# Altium footprint library connectors.PcbLib: 98 footprints (part 4 of 7)
Each footprint in its own frame and in the unit in brackets; x right, y up, seen from the top. Pads: shape width x height; smd on the part's side, far side on the other; paste and mask are expansions set on the pad; w line width, h text height; cw(c..) or ccw(c..) is an arc to the next point about the centre after c.
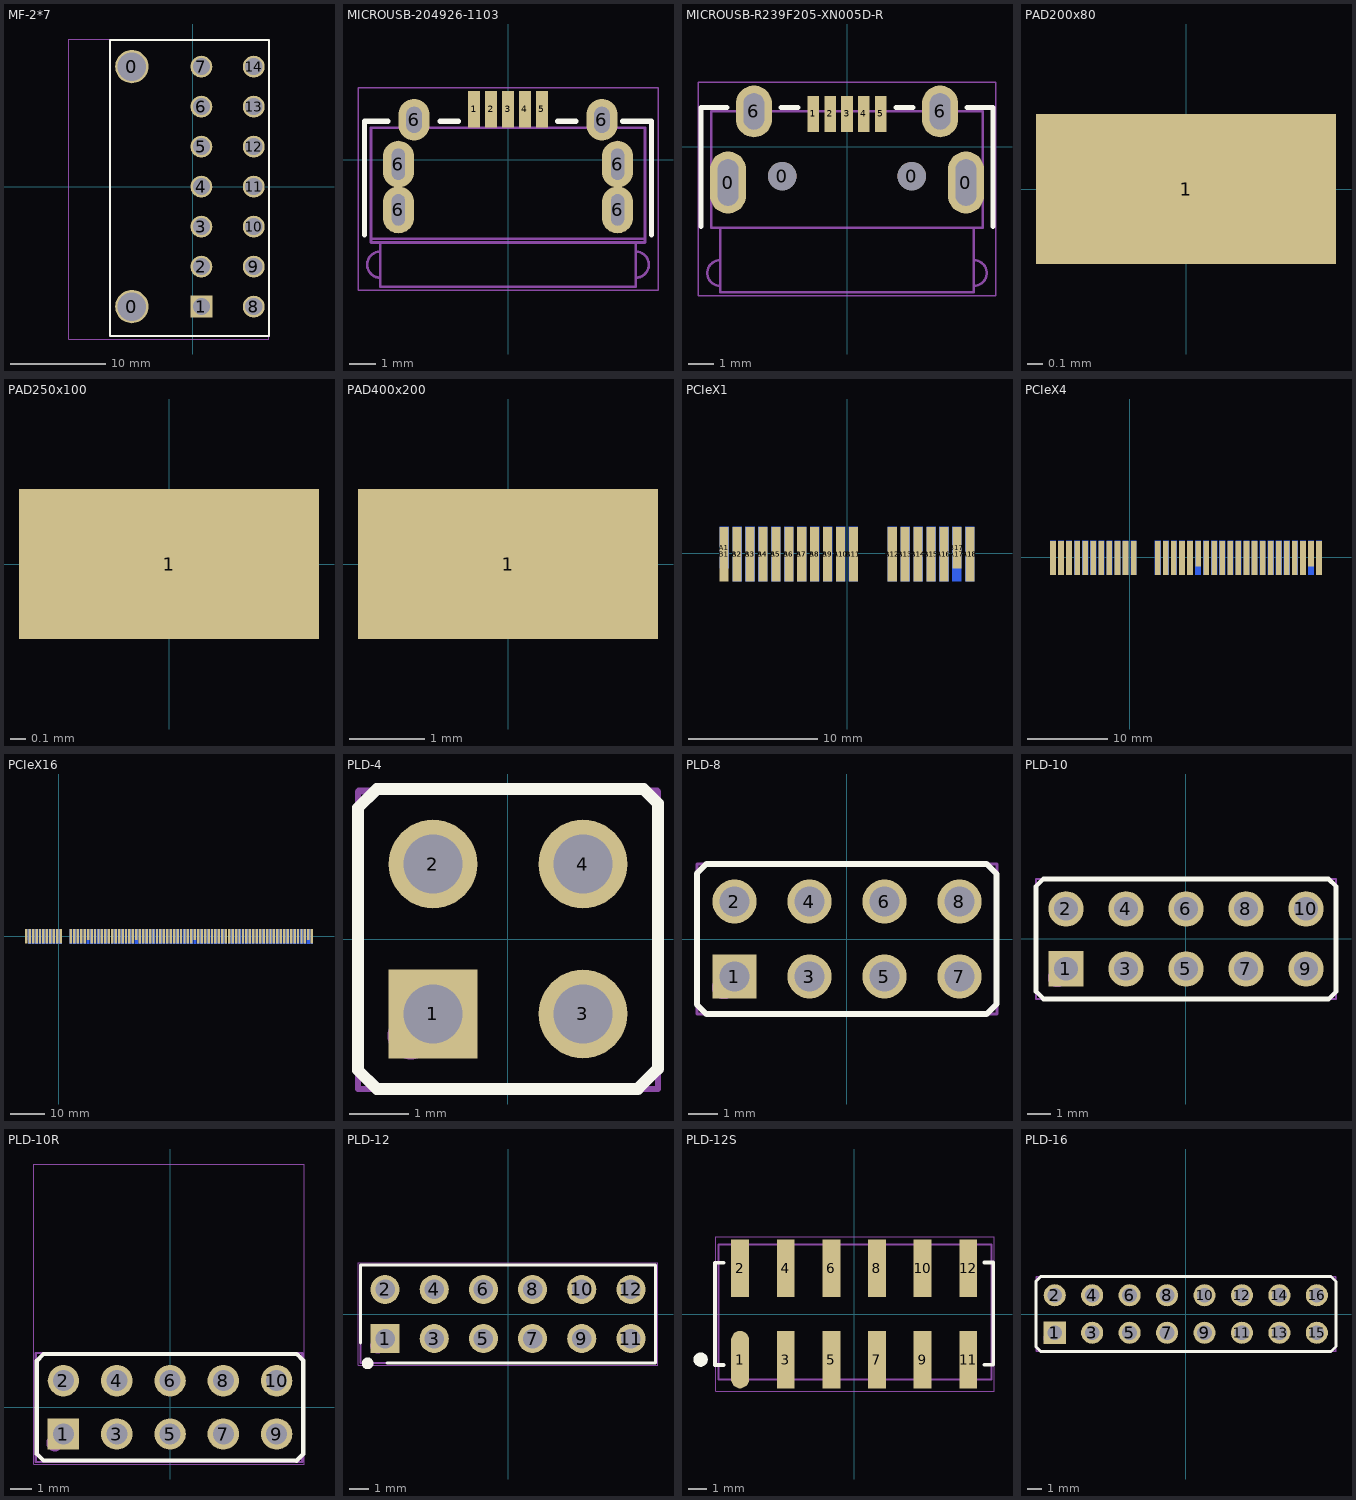
[diagram p3: the footprints below, top view; thin cyan lines are the x and y axes]

## MF-2*7 [mm]
pads (16):
  round 3.5 hole 3: 0(-6.4,-12.6) 0(-6.4,12.6)
  rect 2.3x2.3 hole 1.8: 1(0.9,-12.6)
  round 2.3 hole 1.8: 2(0.9,-8.4) 3(0.9,-4.2) 4(0.9,0) 5(0.9,4.2) 6(0.9,8.4) 7(0.9,12.6) 8(6.4,-12.6) 9(6.4,-8.4) 10(6.4,-4.2) 11(6.4,0) 12(6.4,4.2) 13(6.4,8.4) 14(6.4,12.6)
Top Overlay:
  lines w0.2: -8.7,-15.7 8,-15.7 8,15.4 -8.7,15.4 -8.7,-15.7
Top Assy:
  lines w0.1: -8.6,-15.7 8,-15.7 8,15.4 -8.6,15.4 -8.6,-15.7
Top Cortyard:
  lines w0.05: -13,-16 -13,15.5 8,15.5 8,-16 -13,-16
3D body "MF-2x7.stp": height 11.4, standoff -3.6, extent -13,-15.7 6.935,15.3

## MICROUSB-204926-1103 [mm] "Molex Sealed USB"
pads (11):
  rect 0.45x1.4 smd: 1(-1.3,1.925) 2(-0.65,1.925) 3(0,1.925) 4(0.65,1.925) 5(1.3,1.925)
  oval 1.2x1.8 hole 0.5 slot 1.2 at 90 deg: 6(-4.2,-1.925) 6(-4.2,-0.175) 6(4.2,-1.925) 6(4.2,-0.175)
  oval 1.2x1.6 hole 0.6 slot 1 at 90 deg: 6(-3.6,1.525) 6(3.6,1.525)
Top Overlay:
  lines w0.2: -5.5,-2.875 -5.5,1.475 -4.6,1.475 ; -2.6,1.475 -1.9,1.475 ; 1.9,1.475 2.6,1.475 ; 4.4,1.475 5.5,1.475 5.5,-2.875
Top Assy:
  lines w0.1: -5.25,-3.025 5.25,-3.025 ; -4.9,-4.525 cw(c-4.9,-4.025) -4.9,-3.525 ; -4.9,-3.175 -4.9,-4.875 4.9,-4.875 4.9,-3.175 ; 4.9,-4.525 ccw(c4.9,-4.025) 4.9,-3.525 ; -5.25,-3.175 5.25,-3.175 5.25,1.225 -5.25,1.225 -5.25,-3.175
Top Cortyard:
  lines w0.05: -5.75,-5 5.75,-5 5.75,2.75 -5.75,2.75 -5.75,-5
3D body "2049261103.stp": height 3.95, standoff -1, extent -4.65,-4.825 4.65,2.175

## MICROUSB-R239F205-XN005D-R [mm] "Astron Sealed USB"
pads (11):
  oval 1.4x2.4 hole 0.8 slot 1.8 at 90 deg unplated: 0(-4.6,-1.375) 0(4.6,-1.375)
  round 1.1 hole 1.1 unplated: 0(-2.5,-1.125) 0(2.5,-1.125)
  rect 0.45x1.4 smd: 1(-1.3,1.275) 2(-0.65,1.275) 3(0,1.275) 4(0.65,1.275) 5(1.3,1.275)
  oval 1.4x2 hole 0.8 slot 1.4 at 90 deg unplated: 6(-3.6,1.375) 6(3.6,1.375)
Top Overlay:
  lines w0.2: -5.65,-3.075 -5.65,1.525 -4.65,1.525 ; -2.55,1.525 -1.9,1.525 ; 1.9,1.525 2.55,1.525 ; 4.65,1.525 5.65,1.525 5.65,-3.075
Top Assy:
  lines w0.1: -4.9,-5.375 cw(c-4.9,-4.875) -4.9,-4.375 ; -4.9,-3.125 -4.9,-5.625 4.9,-5.625 4.9,-3.125 ; 4.9,-5.375 ccw(c4.9,-4.875) 4.9,-4.375 ; -5.25,-3.125 -5.25,1.375 5.25,1.375 5.25,-3.125 -5.25,-3.125
Top Cortyard:
  lines w0.05: -5.75,-5.75 5.75,-5.75 5.75,2.5 -5.75,2.5 -5.75,-5.75
3D body "USB_разъем_R239F205-XN005D-R_(условно).STEP": height 5.48, standoff -1.5, extent -5.5,-5.65 5.5,1.35

## PAD200x80 [mm] "2mm x 0.8mm SMD Pad"
pads (1):
  rect 2x1 smd: 1(0,0)

## PAD250x100 [mm] "2.5mm x 1.0mm SMD Pad"
pads (1):
  rect 2x1 smd: 1(0,0)

## PAD400x200 [mm] "4mm x 2mm SMD Pad"
pads (1):
  rect 4x2 smd: 1(0,0)

## PCIeX1 [mm] "Golden finger, PCIeX1, Dual, Opposite, Pitch 1mm, 36-Position"
pads (36):
  rect 0.7x3.2 smd far side paste-1: A1(-9.5,0.45)
  rect 0.7x4.2 smd far side paste-1: A2(-8.5,-0.05) A3(-7.5,-0.05) A4(-6.5,-0.05) A5(-5.5,-0.05) A6(-4.5,-0.05) A7(-3.5,-0.05) A8(-2.5,-0.05) A9(-1.5,-0.05) A10(-0.5,-0.05) A11(0.5,-0.05) A12(3.5,-0.05) A13(4.5,-0.05) A14(5.5,-0.05) A15(6.5,-0.05) A16(7.5,-0.05) A17(8.5,-0.05) A18(9.5,-0.05)
  rect 0.7x4.2 smd paste-1: B1(-9.5,-0.05) B2(-8.5,-0.05) B3(-7.5,-0.05) B4(-6.5,-0.05) B5(-5.5,-0.05) B6(-4.5,-0.05) B7(-3.5,-0.05) B8(-2.5,-0.05) B9(-1.5,-0.05) B10(-0.5,-0.05) B11(0.5,-0.05) B12(3.5,-0.05) B13(4.5,-0.05) B14(5.5,-0.05) B15(6.5,-0.05) B16(7.5,-0.05) B18(9.5,-0.05)
  rect 0.7x3.2 smd paste-1: B17(8.5,0.45)
Top Solder:
  rectangle: -10.4,-3.8 10.4,2.175
Bottom Solder:
  rectangle: -10.4,-3.8 10.4,2.175

## PCIeX4 [mm] "Golden finger, PCIeX4, Dual, Opposite, Pitch 1mm, 64-Position"
pads (64):
  rect 0.7x3.2 smd far side paste-1: A1(-9.5,0.45)
  rect 0.7x4.2 smd far side paste-1: A2(-8.5,-0.05) A3(-7.5,-0.05) A4(-6.5,-0.05) A5(-5.5,-0.05) A6(-4.5,-0.05) A7(-3.5,-0.05) A8(-2.5,-0.05) A9(-1.5,-0.05) A10(-0.5,-0.05) A11(0.5,-0.05) A12(3.5,-0.05) A13(4.5,-0.05) A14(5.5,-0.05) A15(6.5,-0.05) A16(7.5,-0.05) A17(8.5,-0.05) A18(9.5,-0.05) A19(10.5,-0.05) A20(11.5,-0.05) A21(12.5,-0.05) A22(13.5,-0.05) A23(14.5,-0.05) A24(15.5,-0.05) A25(16.5,-0.05) A26(17.5,-0.05) A27(18.5,-0.05) A28(19.5,-0.05) A29(20.5,-0.05) A30(21.5,-0.05) A31(22.5,-0.05) A32(23.5,-0.05)
  rect 0.7x4.2 smd paste-1: B1(-9.5,-0.05) B2(-8.5,-0.05) B3(-7.5,-0.05) B4(-6.5,-0.05) B5(-5.5,-0.05) B6(-4.5,-0.05) B7(-3.5,-0.05) B8(-2.5,-0.05) B9(-1.5,-0.05) B10(-0.5,-0.05) B11(0.5,-0.05) B12(3.5,-0.05) B13(4.5,-0.05) B14(5.5,-0.05) B15(6.5,-0.05) B16(7.5,-0.05) B18(9.5,-0.05) B19(10.5,-0.05) B20(11.5,-0.05) B21(12.5,-0.05) B22(13.5,-0.05) B23(14.5,-0.05) B24(15.5,-0.05) B25(16.5,-0.05) B26(17.5,-0.05) B27(18.5,-0.05) B28(19.5,-0.05) B29(20.5,-0.05) B30(21.5,-0.05) B32(23.5,-0.05)
  rect 0.7x3.2 smd paste-1: B17(8.5,0.45) B31(22.5,0.45)
Top Solder:
  rectangle: -10.4,-3.8 24.4,2.175
Bottom Solder:
  rectangle: -10.4,-3.8 24.4,2.175

## PCIeX16 [mm] "Golden finger, PCIeX16, Dual, Opposite, Pitch 1mm, 164-Position"
pads (164):
  rect 0.7x3.2 smd far side paste-1: A1(-9.5,0.5)
  rect 0.7x4.2 smd far side paste-1: A2(-8.5,0) A3(-7.5,0) A4(-6.5,0) A5(-5.5,0) A6(-4.5,0) A7(-3.5,0) A8(-2.5,0) A9(-1.5,0) A10(-0.5,0) A11(0.5,0) A12(3.5,0) A13(4.5,0) A14(5.5,0) A15(6.5,0) A16(7.5,0) A17(8.5,0) A18(9.5,0) A19(10.5,0) A20(11.5,0) A21(12.5,0) A22(13.5,0) A23(14.5,0) A24(15.5,0) A25(16.5,0) A26(17.5,0) A27(18.5,0) A28(19.5,0) A29(20.5,0) A30(21.5,0) A31(22.5,0) A32(23.5,0) A33(24.5,0) A34(25.5,0) A35(26.5,0) A36(27.5,0) A37(28.5,0) A38(29.5,0) A39(30.5,0) A40(31.5,0) A41(32.5,0) A42(33.5,0) A43(34.5,0) A44(35.5,0) A45(36.5,0) A46(37.5,0) A47(38.5,0) A48(39.5,0) A49(40.5,0) A50(41.5,0) A51(42.5,0) A52(43.5,0) A53(44.5,0) A54(45.5,0) A55(46.5,0) A56(47.5,0) A57(48.5,0) A58(49.5,0) A59(50.5,0) A60(51.5,0) A61(52.5,0) A62(53.5,0) A63(54.5,0) A64(55.5,0) A65(56.5,0) A66(57.5,0) A67(58.5,0) A68(59.5,0) A69(60.5,0) A70(61.5,0) A71(62.5,0) A72(63.5,0) A73(64.5,0) A74(65.5,0) A75(66.5,0) A76(67.5,0) A77(68.5,0) A78(69.5,0) A79(70.5,0) A80(71.5,0) A81(72.5,0) A82(73.5,0)
  rect 0.7x4.2 smd paste-1: B1(-9.5,0) B2(-8.5,0) B3(-7.5,0) B4(-6.5,0) B5(-5.5,0) B6(-4.5,0) B7(-3.5,0) B8(-2.5,0) B9(-1.5,0) B10(-0.5,0) B11(0.5,0) B12(3.5,0) B13(4.5,0) B14(5.5,0) B15(6.5,0) B16(7.5,0) B18(9.5,0) B19(10.5,0) B20(11.5,0) B21(12.5,0) B22(13.5,0) B23(14.5,0) B24(15.5,0) B25(16.5,0) B26(17.5,0) B27(18.5,0) B28(19.5,0) B29(20.5,0) B30(21.5,0) B32(23.5,0) B33(24.5,0) B34(25.5,0) B35(26.5,0) B36(27.5,0) B37(28.5,0) B38(29.5,0) B39(30.5,0) B40(31.5,0) B41(32.5,0) B42(33.5,0) B43(34.5,0) B44(35.5,0) B45(36.5,0) B46(37.5,0) B47(38.5,0) B49(40.5,0) B50(41.5,0) B51(42.5,0) B52(43.5,0) B53(44.5,0) B54(45.5,0) B55(46.5,0) B56(47.5,0) B57(48.5,0) B58(49.5,0) B59(50.5,0) B60(51.5,0) B61(52.5,0) B62(53.5,0) B63(54.5,0) B64(55.5,0) B65(56.5,0) B66(57.5,0) B67(58.5,0) B68(59.5,0) B69(60.5,0) B70(61.5,0) B71(62.5,0) B72(63.5,0) B73(64.5,0) B74(65.5,0) B75(66.5,0) B76(67.5,0) B77(68.5,0) B78(69.5,0) B79(70.5,0) B80(71.5,0) B82(73.5,0)
  rect 0.7x3.2 smd paste-1: B17(8.5,0.5) B31(22.5,0.5) B48(39.5,0.5) B81(72.5,0.5)
Top Solder:
  rectangle: -10.4,-3.75 74.4,2.225
Bottom Solder:
  rectangle: -10.4,-3.75 74.4,2.225

## PLD-4 [mm]
height 8.38
pads (4):
  rect 1.5x1.5 hole 1: 1(-1.27,-1.27)
  round 1.5 hole 1: 2(-1.27,1.27) 3(1.27,-1.27) 4(1.27,1.27)
Top Overlay:
  lines w0.2: -2.54,-2.222 -2.54,2.222 -2.222,2.54 2.3,2.54 2.54,2.3 2.54,-2.2 2.2,-2.54 -2.222,-2.54 -2.54,-2.222
Top Assy:
  circle w0.4: c-1.64,-1.64 r0.2
  lines w0.1: -2.54,-2.54 2.54,-2.54 2.54,2.5 -2.54,2.5 -2.54,-2.54
Top Cortyard:
  lines w0.05: -2.54,-2.54 2.54,-2.54 2.54,2.54 -2.54,2.54 -2.54,-2.54
3D body "DS1021-2x2SF11.stp": height 8.6, standoff -3, extent -2.54,-2.54 2.54,2.54

## PLD-8 [mm]
height 8.38
pads (8):
  rect 1.5x1.5 hole 1: 1(-3.81,-1.27)
  round 1.5 hole 1: 2(-3.81,1.27) 3(-1.27,-1.27) 4(-1.27,1.27) 5(1.27,-1.27) 6(1.27,1.27) 7(3.81,-1.27) 8(3.81,1.27)
Top Overlay:
  lines w0.2: -5.08,-2.222 -5.08,2.222 -4.763,2.54 4.73,2.54 5.07,2.2 5.07,-2.2 4.73,-2.54 -4.763,-2.54 -5.08,-2.222
Top Assy:
  circle w0.4: c-4.18,-1.64 r0.2
  lines w0.1: -5.08,-2.54 5.08,-2.54 5.08,2.54 -5.08,2.54 -5.08,-2.54
Top Cortyard:
  lines w0.05: -5.08,-2.54 5.07,-2.54 5.07,2.54 -5.08,2.54 -5.08,-2.54
3D body "DS1021-2x4SF11.stp": height 8.6, standoff -3, extent -5.08,-2.54 5.08,2.54

## PLD-10 [mm]
height 8.38
pads (10):
  rect 1.5x1.5 hole 1: 1(-5.08,-1.27)
  round 1.5 hole 1: 2(-5.08,1.27) 3(-2.54,-1.27) 4(-2.54,1.27) 5(0,-1.27) 6(0,1.27) 7(2.54,-1.27) 8(2.54,1.27) 9(5.08,-1.27) 10(5.08,1.27)
Top Overlay:
  lines w0.2: 6.032,-2.545 6.35,-2.228 6.35,2.228 6.043,2.535 ; 6.032,-2.54 -6.032,-2.54 -6.35,-2.222 -6.35,2.222 -6.032,2.54 6.043,2.54
Top Assy:
  circle w0.4: c-5.45,-1.64 r0.2
  lines w0.1: -6.35,-2.54 6.35,-2.54 6.35,2.54 -6.35,2.54 -6.35,-2.54
Top Cortyard:
  lines w0.05: -6.35,-2.54 -6.35,2.54 6.35,2.54 6.35,-2.54 -6.35,-2.54
3D body "DS1021-2x5SF11.stp": height 8.6, standoff -3, extent -6.35,-2.54 6.35,2.54

## PLD-10R [mm]
height 5
pads (10):
  rect 1.5x1.5 hole 1: 1(-5.08,-1.27)
  round 1.5 hole 1: 2(-5.08,1.27) 3(-2.54,-1.27) 4(-2.54,1.27) 5(0,-1.27) 6(0,1.27) 7(2.54,-1.27) 8(2.54,1.27) 9(5.08,-1.27) 10(5.08,1.27)
Top Overlay:
  lines w0.2: 6.032,-2.545 6.35,-2.228 6.35,2.228 6.043,2.535 ; 6.032,-2.54 -6.032,-2.54 -6.35,-2.222 -6.35,2.222 -6.032,2.54 6.043,2.54
Top Assy:
  circle w0.4: c-5.5,-1.7 r0.2
  lines w0.1: -6.4,-2.6 -6.4,2.6 6.3,2.6 6.3,-2.6 -6.4,-2.6
Top Cortyard:
  lines w0.05: -6.5,-2.7 -6.5,11.6 6.4,11.6 6.4,-2.7 -6.5,-2.7
3D body "DS1022-2x5RF11.stp": height 5.08, standoff -3, extent -6.4,-1.525 6.3,11.525

## PLD-12 [mm]
height 8.38
pads (12):
  rect 1.5x1.5 hole 1: 1(-6.35,-1.27)
  round 1.5 hole 1: 2(-6.35,1.27) 3(-3.81,-1.27) 4(-3.81,1.27) 5(-1.27,-1.27) 6(-1.27,1.27) 7(1.27,-1.27) 8(1.27,1.27) 9(3.81,-1.27) 10(3.81,1.27) 11(6.35,-1.27) 12(6.35,1.27)
Top Overlay:
  circle w0.4: c-7.25,-2.55 r0.1
  lines w0.15: -7.62,-1.5 -7.62,2.54 7.62,2.54 7.62,-2.54 -6.25,-2.54
Top Assy:
  circle w0.4: c-6.72,-1.64 r0.2
  lines w0.1: -7.62,-2.54 -7.62,2.54 7.62,2.54 7.62,-2.54 -7.62,-2.54
Top Cortyard:
  lines w0.05: -7.75,-2.65 7.75,-2.65 7.75,2.65 -7.75,2.65 -7.75,-2.65

## PLD-12S [mm]
pads (12):
  oval 1x3.2 smd: 1(-6.35,-2.542)
  rect 1x3.2 smd: 2(-6.35,2.542) 3(-3.81,-2.538) 4(-3.81,2.542) 5(-1.27,-2.538) 6(-1.27,2.542) 7(1.27,-2.538) 8(1.27,2.542) 9(3.81,-2.538) 10(3.81,2.542) 11(6.35,-2.538) 12(6.35,2.542)
Top Overlay:
  circle w0.4: c-8.55,-2.538 r0.2
  lines w0.2: -7.25,-2.838 -7.75,-2.838 -7.75,2.862 -7.25,2.862 ; 7.25,-2.834 7.75,-2.834 7.75,2.866 7.25,2.866
Top Assy:
  circle w0.4: c-6.35,-2.45 r0.2
  lines w0.1: -7.55,-3.638 -7.55,3.862 7.65,3.862 7.65,-3.638 -7.55,-3.638
Top Cortyard:
  lines w0.05: -7.7,-4.3 -7.7,4.3 7.8,4.3 7.8,-4.3 -7.7,-4.3
3D body "65693.stp": height 9.57, standoff -0.03, extent -7.57,-3.688 7.67,3.812

## PLD-16 [mm]
height 8.38
pads (16):
  rect 1.5x1.5 hole 1: 1(-8.89,-1.27)
  round 1.5 hole 1: 2(-8.89,1.27) 3(-6.35,-1.27) 4(-6.35,1.27) 5(-3.81,-1.27) 6(-3.81,1.27) 7(-1.27,-1.27) 8(-1.27,1.27) 9(1.27,-1.27) 10(1.27,1.27) 11(3.81,-1.27) 12(3.81,1.27) 13(6.35,-1.27) 14(6.35,1.27) 15(8.89,-1.27) 16(8.89,1.27)
Top Overlay:
  lines w0.2: -10.16,-2.222 -9.842,-2.54 9.85,-2.54 10.19,-2.2 10.19,2.2 9.85,2.54 -9.842,2.54 -10.16,2.222 -10.16,-2.222
Top Assy:
  circle w0.4: c-9.26,-1.64 r0.2
  lines w0.1: -10.16,-2.54 -10.16,2.54 10.16,2.54 10.16,-2.54 -10.16,-2.54
Top Cortyard:
  lines w0.05: -10.16,-2.54 -10.16,2.54 10.19,2.54 10.19,-2.54 -10.16,-2.54
3D body "DS1021-2x8SF11.stp": height 8.6, standoff -3, extent -10.16,-2.54 10.16,2.54